# Altium integrated library Samtec_2,54_mm_Pitch_Socket_Strips.IntLib: 489 symbols (part 1 of 4) (continued)
## ESW-127-12-L-D
designator J?
Elevated Socket, Through-hole, Vertical, -55 to 125 degC, 2.54 mm Pitch, 54-Pin, Female, RoHS; Manufacturer: Samtec; PartNumber: ESW-127-12-L-D; Pitch: 2.54 mm; DatasheetVersion: F-214; PackageVersion: AV, 7/1985; PackageReference: ESW-127-12-X-D; PackageDescription: ESW Strip ASM; Orientation: Vertical; RoHS: True; Temperature Range: -55 to 125 degC; Mounting Technology: Through-hole; ComponentLink1Description: Manufacturer URL; ComponentLink1URL: http://www.samtec.com; ComponentLink2Description: Datasheet; ComponentLink2URL: http://www.samtec.com/documents/webfiles/pdf/ESW_TH.PDF; ComponentLink3Description: Package Specification; ComponentLink3URL: http://www.samtec.com/documents/webfiles/cpdf/ESW-1XX-XX-X-X-XX-XX-MKT.pdf
footprint SMTC-ESW-127-12-X-D (Elevated Socket, 2x27 Pins, Vertical, 2.54mm Pitch, Female)
pins: 1, 2, 3, 4, 5, 6, 7, 8, 9, 10, 11, 12, 13, 14, 15, 16, 17, 18, 19, 20, 21, 22, 23, 24, 25, 26, 27, 28, 29, 30, 31, 32, 33, 34, 35, 36, 37, 38, 39, 40, 41, 42, 43, 44, 45, 46, 47, 48, 49, 50, 51, 52, 53, 54

## ESW-127-12-T-D
designator J?
Elevated Socket, Through-hole, Vertical, -55 to 105 degC, 2.54 mm Pitch, 54-Pin, Female, RoHS; Manufacturer: Samtec; PartNumber: ESW-127-12-T-D; Pitch: 2.54 mm; DatasheetVersion: F-214; PackageVersion: AV, 7/1985; PackageReference: ESW-127-12-X-D; PackageDescription: ESW Strip ASM; Orientation: Vertical; RoHS: True; Temperature Range: -55 to 105 degC; Mounting Technology: Through-hole; ComponentLink1Description: Manufacturer URL; ComponentLink1URL: http://www.samtec.com; ComponentLink2Description: Datasheet; ComponentLink2URL: http://www.samtec.com/documents/webfiles/pdf/ESW_TH.PDF; ComponentLink3Description: Package Specification; ComponentLink3URL: http://www.samtec.com/documents/webfiles/cpdf/ESW-1XX-XX-X-X-XX-XX-MKT.pdf
footprint SMTC-ESW-127-12-X-D (Elevated Socket, 2x27 Pins, Vertical, 2.54mm Pitch, Female)
pins: 1, 2, 3, 4, 5, 6, 7, 8, 9, 10, 11, 12, 13, 14, 15, 16, 17, 18, 19, 20, 21, 22, 23, 24, 25, 26, 27, 28, 29, 30, 31, 32, 33, 34, 35, 36, 37, 38, 39, 40, 41, 42, 43, 44, 45, 46, 47, 48, 49, 50, 51, 52, 53, 54

## ESW-129-12-G-D
designator J?
Elevated Socket, Through-hole, Vertical, -55 to 125 degC, 2.54 mm Pitch, 58-Pin, Female, RoHS; Manufacturer: Samtec; PartNumber: ESW-129-12-G-D; Pitch: 2.54 mm; DatasheetVersion: F-214; PackageVersion: AV, 7/1985; PackageReference: ESW-129-12-X-D; PackageDescription: ESW Strip ASM; Orientation: Vertical; RoHS: True; Temperature Range: -55 to 125 degC; Mounting Technology: Through-hole; ComponentLink1Description: Manufacturer URL; ComponentLink1URL: http://www.samtec.com; ComponentLink2Description: Datasheet; ComponentLink2URL: http://www.samtec.com/documents/webfiles/pdf/ESW_TH.PDF; ComponentLink3Description: Package Specification; ComponentLink3URL: http://www.samtec.com/documents/webfiles/cpdf/ESW-1XX-XX-X-X-XX-XX-MKT.pdf
footprint SMTC-ESW-129-12-X-D (Elevated Socket, 2x29 Pins, Vertical, 2.54mm Pitch, Female)
pins: 1, 2, 3, 4, 5, 6, 7, 8, 9, 10, 11, 12, 13, 14, 15, 16, 17, 18, 19, 20, 21, 22, 23, 24, 25, 26, 27, 28, 29, 30, 31, 32, 33, 34, 35, 36, 37, 38, 39, 40, 41, 42, 43, 44, 45, 46, 47, 48, 49, 50, 51, 52, 53, 54, 55, 56, 57, 58

## ESW-129-12-L-D
designator J?
Elevated Socket, Through-hole, Vertical, -55 to 125 degC, 2.54 mm Pitch, 58-Pin, Female, RoHS; Manufacturer: Samtec; PartNumber: ESW-129-12-L-D; Pitch: 2.54 mm; DatasheetVersion: F-214; PackageVersion: AV, 7/1985; PackageReference: ESW-129-12-X-D; PackageDescription: ESW Strip ASM; Orientation: Vertical; RoHS: True; Temperature Range: -55 to 125 degC; Mounting Technology: Through-hole; ComponentLink1Description: Manufacturer URL; ComponentLink1URL: http://www.samtec.com; ComponentLink2Description: Datasheet; ComponentLink2URL: http://www.samtec.com/documents/webfiles/pdf/ESW_TH.PDF; ComponentLink3Description: Package Specification; ComponentLink3URL: http://www.samtec.com/documents/webfiles/cpdf/ESW-1XX-XX-X-X-XX-XX-MKT.pdf
footprint SMTC-ESW-129-12-X-D (Elevated Socket, 2x29 Pins, Vertical, 2.54mm Pitch, Female)
pins: 1, 2, 3, 4, 5, 6, 7, 8, 9, 10, 11, 12, 13, 14, 15, 16, 17, 18, 19, 20, 21, 22, 23, 24, 25, 26, 27, 28, 29, 30, 31, 32, 33, 34, 35, 36, 37, 38, 39, 40, 41, 42, 43, 44, 45, 46, 47, 48, 49, 50, 51, 52, 53, 54, 55, 56, 57, 58

## ESW-129-12-T-D
designator J?
Elevated Socket, Through-hole, Vertical, -55 to 105 degC, 2.54 mm Pitch, 58-Pin, Female, RoHS; Manufacturer: Samtec; PartNumber: ESW-129-12-T-D; Pitch: 2.54 mm; DatasheetVersion: F-214; PackageVersion: AV, 7/1985; PackageReference: ESW-129-12-X-D; PackageDescription: ESW Strip ASM; Orientation: Vertical; RoHS: True; Temperature Range: -55 to 105 degC; Mounting Technology: Through-hole; ComponentLink1Description: Manufacturer URL; ComponentLink1URL: http://www.samtec.com; ComponentLink2Description: Datasheet; ComponentLink2URL: http://www.samtec.com/documents/webfiles/pdf/ESW_TH.PDF; ComponentLink3Description: Package Specification; ComponentLink3URL: http://www.samtec.com/documents/webfiles/cpdf/ESW-1XX-XX-X-X-XX-XX-MKT.pdf
footprint SMTC-ESW-129-12-X-D (Elevated Socket, 2x29 Pins, Vertical, 2.54mm Pitch, Female)
pins: 1, 2, 3, 4, 5, 6, 7, 8, 9, 10, 11, 12, 13, 14, 15, 16, 17, 18, 19, 20, 21, 22, 23, 24, 25, 26, 27, 28, 29, 30, 31, 32, 33, 34, 35, 36, 37, 38, 39, 40, 41, 42, 43, 44, 45, 46, 47, 48, 49, 50, 51, 52, 53, 54, 55, 56, 57, 58

## ESW-129-44-G-D
designator J?
Elevated Socket, Through-hole, Vertical, -55 to 125 degC, 2.54 mm Pitch, 58-Pin, Female, RoHS; Manufacturer: Samtec; PartNumber: ESW-129-44-G-D; Pitch: 2.54 mm; DatasheetVersion: F-214; PackageVersion: AV, 7/1985; PackageReference: ESW-129-44-X-D; PackageDescription: ESW Strip ASM; Orientation: Vertical; RoHS: True; Temperature Range: -55 to 125 degC; Mounting Technology: Through-hole; ComponentLink1Description: Manufacturer URL; ComponentLink1URL: http://www.samtec.com; ComponentLink2Description: Datasheet; ComponentLink2URL: http://www.samtec.com/documents/webfiles/pdf/ESW_TH.PDF; ComponentLink3Description: Package Specification; ComponentLink3URL: http://www.samtec.com/documents/webfiles/cpdf/ESW-1XX-XX-X-X-XX-XX-MKT.pdf
footprint SMTC-ESW-129-44-X-D (Elevated Socket, 2x29 Pins, Vertical, 2.54mm Pitch, Female)
pins: 1, 2, 3, 4, 5, 6, 7, 8, 9, 10, 11, 12, 13, 14, 15, 16, 17, 18, 19, 20, 21, 22, 23, 24, 25, 26, 27, 28, 29, 30, 31, 32, 33, 34, 35, 36, 37, 38, 39, 40, 41, 42, 43, 44, 45, 46, 47, 48, 49, 50, 51, 52, 53, 54, 55, 56, 57, 58

## ESW-129-44-L-D
designator J?
Elevated Socket, Through-hole, Vertical, -55 to 125 degC, 2.54 mm Pitch, 58-Pin, Female, RoHS; Manufacturer: Samtec; PartNumber: ESW-129-44-L-D; Pitch: 2.54 mm; DatasheetVersion: F-214; PackageVersion: AV, 7/1985; PackageReference: ESW-129-44-X-D; PackageDescription: ESW Strip ASM; Orientation: Vertical; RoHS: True; Temperature Range: -55 to 125 degC; Mounting Technology: Through-hole; ComponentLink1Description: Manufacturer URL; ComponentLink1URL: http://www.samtec.com; ComponentLink2Description: Datasheet; ComponentLink2URL: http://www.samtec.com/documents/webfiles/pdf/ESW_TH.PDF; ComponentLink3Description: Package Specification; ComponentLink3URL: http://www.samtec.com/documents/webfiles/cpdf/ESW-1XX-XX-X-X-XX-XX-MKT.pdf
footprint SMTC-ESW-129-44-X-D (Elevated Socket, 2x29 Pins, Vertical, 2.54mm Pitch, Female)
pins: 1, 2, 3, 4, 5, 6, 7, 8, 9, 10, 11, 12, 13, 14, 15, 16, 17, 18, 19, 20, 21, 22, 23, 24, 25, 26, 27, 28, 29, 30, 31, 32, 33, 34, 35, 36, 37, 38, 39, 40, 41, 42, 43, 44, 45, 46, 47, 48, 49, 50, 51, 52, 53, 54, 55, 56, 57, 58

## ESW-129-44-T-D
designator J?
Elevated Socket, Through-hole, Vertical, -55 to 105 degC, 2.54 mm Pitch, 58-Pin, Female, RoHS; Manufacturer: Samtec; PartNumber: ESW-129-44-T-D; Pitch: 2.54 mm; DatasheetVersion: F-214; PackageVersion: AV, 7/1985; PackageReference: ESW-129-44-X-D; PackageDescription: ESW Strip ASM; Orientation: Vertical; RoHS: True; Temperature Range: -55 to 105 degC; Mounting Technology: Through-hole; ComponentLink1Description: Manufacturer URL; ComponentLink1URL: http://www.samtec.com; ComponentLink2Description: Datasheet; ComponentLink2URL: http://www.samtec.com/documents/webfiles/pdf/ESW_TH.PDF; ComponentLink3Description: Package Specification; ComponentLink3URL: http://www.samtec.com/documents/webfiles/cpdf/ESW-1XX-XX-X-X-XX-XX-MKT.pdf
footprint SMTC-ESW-129-44-X-D (Elevated Socket, 2x29 Pins, Vertical, 2.54mm Pitch, Female)
pins: 1, 2, 3, 4, 5, 6, 7, 8, 9, 10, 11, 12, 13, 14, 15, 16, 17, 18, 19, 20, 21, 22, 23, 24, 25, 26, 27, 28, 29, 30, 31, 32, 33, 34, 35, 36, 37, 38, 39, 40, 41, 42, 43, 44, 45, 46, 47, 48, 49, 50, 51, 52, 53, 54, 55, 56, 57, 58

## ESW-135-24-G-D
designator J?
Elevated Socket, Through-hole, Vertical, -55 to 125 degC, 2.54 mm Pitch, 70-Pin, Female, RoHS; Manufacturer: Samtec; PartNumber: ESW-135-24-G-D; Pitch: 2.54 mm; DatasheetVersion: F-214; PackageVersion: AV, 7/1985; PackageReference: ESW-135-24-X-D; PackageDescription: ESW Strip ASM; Orientation: Vertical; RoHS: True; Temperature Range: -55 to 125 degC; Mounting Technology: Through-hole; ComponentLink1Description: Manufacturer URL; ComponentLink1URL: http://www.samtec.com; ComponentLink2Description: Datasheet; ComponentLink2URL: http://www.samtec.com/documents/webfiles/pdf/ESW_TH.PDF; ComponentLink3Description: Package Specification; ComponentLink3URL: http://www.samtec.com/documents/webfiles/cpdf/ESW-1XX-XX-X-X-XX-XX-MKT.pdf
footprint SMTC-ESW-135-24-X-D (Elevated Socket, 2x35 Pins, Vertical, 2.54mm Pitch, Female)
pins: 1, 2, 3, 4, 5, 6, 7, 8, 9, 10, 11, 12, 13, 14, 15, 16, 17, 18, 19, 20, 21, 22, 23, 24, 25, 26, 27, 28, 29, 30, 31, 32, 33, 34, 35, 36, 37, 38, 39, 40, 41, 42, 43, 44, 45, 46, 47, 48, 49, 50, 51, 52, 53, 54, 55, 56, 57, 58, 59, 60, 61, 62, 63, 64, 65, 66, 67, 68, 69, 70

## ESW-135-24-L-D
designator J?
Elevated Socket, Through-hole, Vertical, -55 to 125 degC, 2.54 mm Pitch, 70-Pin, Female, RoHS; Manufacturer: Samtec; PartNumber: ESW-135-24-L-D; Pitch: 2.54 mm; DatasheetVersion: F-214; PackageVersion: AV, 7/1985; PackageReference: ESW-135-24-X-D; PackageDescription: ESW Strip ASM; Orientation: Vertical; RoHS: True; Temperature Range: -55 to 125 degC; Mounting Technology: Through-hole; ComponentLink1Description: Manufacturer URL; ComponentLink1URL: http://www.samtec.com; ComponentLink2Description: Datasheet; ComponentLink2URL: http://www.samtec.com/documents/webfiles/pdf/ESW_TH.PDF; ComponentLink3Description: Package Specification; ComponentLink3URL: http://www.samtec.com/documents/webfiles/cpdf/ESW-1XX-XX-X-X-XX-XX-MKT.pdf
footprint SMTC-ESW-135-24-X-D (Elevated Socket, 2x35 Pins, Vertical, 2.54mm Pitch, Female)
pins: 1, 2, 3, 4, 5, 6, 7, 8, 9, 10, 11, 12, 13, 14, 15, 16, 17, 18, 19, 20, 21, 22, 23, 24, 25, 26, 27, 28, 29, 30, 31, 32, 33, 34, 35, 36, 37, 38, 39, 40, 41, 42, 43, 44, 45, 46, 47, 48, 49, 50, 51, 52, 53, 54, 55, 56, 57, 58, 59, 60, 61, 62, 63, 64, 65, 66, 67, 68, 69, 70

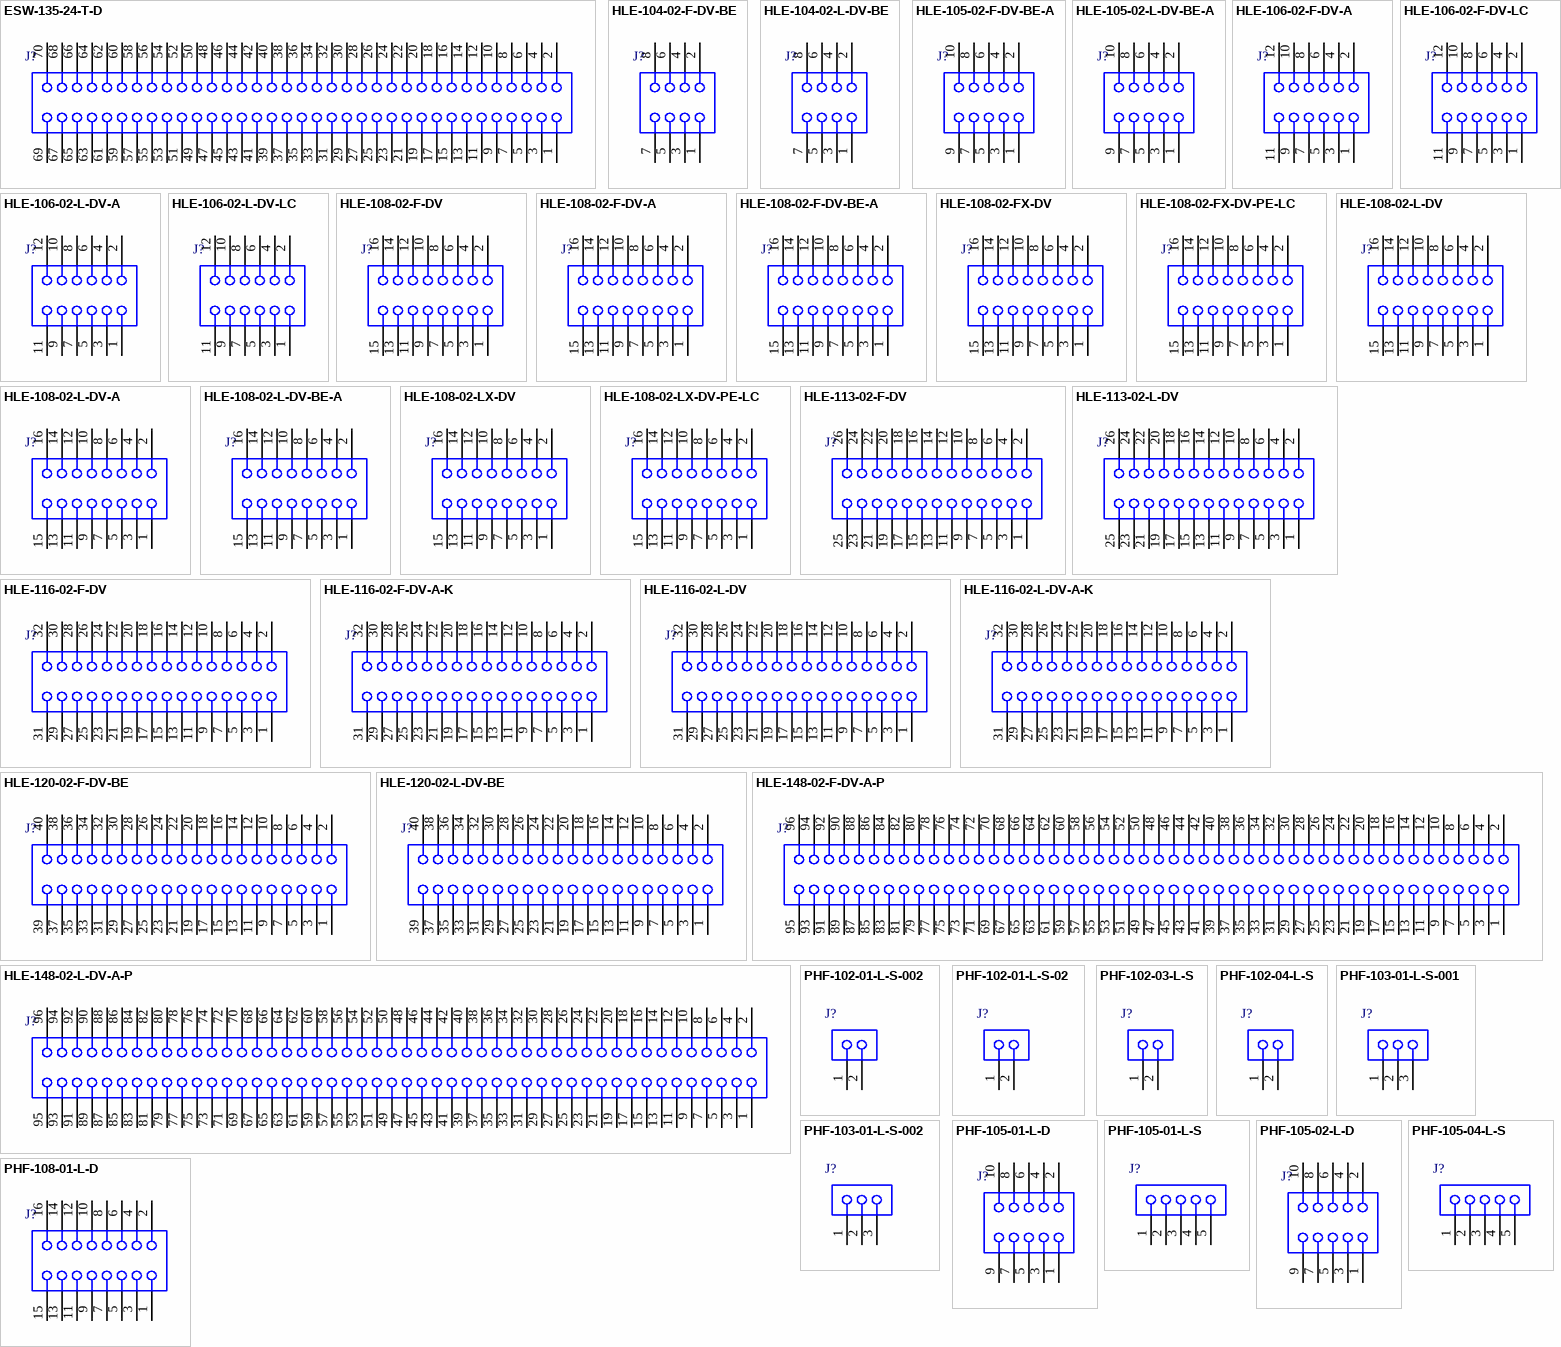
[diagram p2: symbols ESW-135-24-T-D to PHF-108-01-L-D]

## ESW-135-24-T-D
designator J?
Elevated Socket, Through-hole, Vertical, -55 to 105 degC, 2.54 mm Pitch, 70-Pin, Female, RoHS; Manufacturer: Samtec; PartNumber: ESW-135-24-T-D; Pitch: 2.54 mm; DatasheetVersion: F-214; PackageVersion: AV, 7/1985; PackageReference: ESW-135-24-X-D; PackageDescription: ESW Strip ASM; Orientation: Vertical; RoHS: True; Temperature Range: -55 to 105 degC; Mounting Technology: Through-hole; ComponentLink1Description: Manufacturer URL; ComponentLink1URL: http://www.samtec.com; ComponentLink2Description: Datasheet; ComponentLink2URL: http://www.samtec.com/documents/webfiles/pdf/ESW_TH.PDF; ComponentLink3Description: Package Specification; ComponentLink3URL: http://www.samtec.com/documents/webfiles/cpdf/ESW-1XX-XX-X-X-XX-XX-MKT.pdf
footprint SMTC-ESW-135-24-X-D (Elevated Socket, 2x35 Pins, Vertical, 2.54mm Pitch, Female)
pins: 1, 2, 3, 4, 5, 6, 7, 8, 9, 10, 11, 12, 13, 14, 15, 16, 17, 18, 19, 20, 21, 22, 23, 24, 25, 26, 27, 28, 29, 30, 31, 32, 33, 34, 35, 36, 37, 38, 39, 40, 41, 42, 43, 44, 45, 46, 47, 48, 49, 50, 51, 52, 53, 54, 55, 56, 57, 58, 59, 60, 61, 62, 63, 64, 65, 66, 67, 68, 69, 70

## HLE-104-02-F-DV-BE
designator J?
Cost-Effective Reliable Socket, Surface Mount, Vertical, -55 to 125 degC, 2.54 mm Pitch, 8-Pin, Female, RoHS; Manufacturer: Samtec; PartNumber: HLE-104-02-F-DV-BE; Pitch: 2.54 mm; DatasheetVersion: F-214; PackageVersion: AQ, 12/1998; PackageReference: HLE-104-02-X-DV-BE; PackageDescription: .100 Tiger Beam Socket Assembly; Orientation: Vertical; RoHS: True; Temperature Range: -55 to 125 degC; Mounting Technology: Surface Mount; ComponentLink1Description: Manufacturer URL; ComponentLink1URL: http://www.samtec.com; ComponentLink2Description: Datasheet; ComponentLink2URL: http://www.samtec.com/documents/webfiles/pdf/HLE.PDF; ComponentLink3Description: Package Specification; ComponentLink3URL: http://www.samtec.com/documents/webfiles/cpdf/HLE-1XX-02-XXX-DV-XX-XX-XX-MKT.pdf
footprint SMTC-HLE-104-02-X-DV-BE (Tiger Beam Socket Assembly, 2x4 Pins, Vertical, 2.54mm Pitch, Female)
pins: 1, 2, 3, 4, 5, 6, 7, 8

## HLE-104-02-L-DV-BE
designator J?
Cost-Effective Reliable Socket, Surface Mount, Vertical, -55 to 125 degC, 2.54 mm Pitch, 8-Pin, Female, RoHS; Manufacturer: Samtec; PartNumber: HLE-104-02-L-DV-BE; Pitch: 2.54 mm; DatasheetVersion: F-214; PackageVersion: AQ, 12/1998; PackageReference: HLE-104-02-X-DV-BE; PackageDescription: .100 Tiger Beam Socket Assembly; Orientation: Vertical; RoHS: True; Temperature Range: -55 to 125 degC; Mounting Technology: Surface Mount; ComponentLink1Description: Manufacturer URL; ComponentLink1URL: http://www.samtec.com; ComponentLink2Description: Datasheet; ComponentLink2URL: http://www.samtec.com/documents/webfiles/pdf/HLE.PDF; ComponentLink3Description: Package Specification; ComponentLink3URL: http://www.samtec.com/documents/webfiles/cpdf/HLE-1XX-02-XXX-DV-XX-XX-XX-MKT.pdf
footprint SMTC-HLE-104-02-X-DV-BE (Tiger Beam Socket Assembly, 2x4 Pins, Vertical, 2.54mm Pitch, Female)
pins: 1, 2, 3, 4, 5, 6, 7, 8

## HLE-105-02-F-DV-BE-A
designator J?
Cost-Effective Reliable Socket, Surface Mount, Vertical, -55 to 125 degC, 2.54 mm Pitch, 10-Pin, Female, RoHS; Manufacturer: Samtec; PartNumber: HLE-105-02-F-DV-BE-A; Pitch: 2.54 mm; DatasheetVersion: F-214; PackageVersion: AQ, 12/1998; PackageReference: HLE-105-02-X-DV-BE-A; PackageDescription: .100 Tiger Beam Socket Assembly; Orientation: Vertical; RoHS: True; Temperature Range: -55 to 125 degC; Mounting Technology: Surface Mount; ComponentLink1Description: Manufacturer URL; ComponentLink1URL: http://www.samtec.com; ComponentLink2Description: Datasheet; ComponentLink2URL: http://www.samtec.com/documents/webfiles/pdf/HLE.PDF; ComponentLink3Description: Package Specification; ComponentLink3URL: http://www.samtec.com/documents/webfiles/cpdf/HLE-1XX-02-XXX-DV-XX-XX-XX-MKT.pdf
footprint SMTC-HLE-105-02-X-DV-BE-A (Tiger Beam Socket Assembly, 2x5 Pins, Vertical, 2.54mm Pitch, Female)
pins: 1, 2, 3, 4, 5, 6, 7, 8, 9, 10

## HLE-105-02-L-DV-BE-A
designator J?
Cost-Effective Reliable Socket, Surface Mount, Vertical, -55 to 125 degC, 2.54 mm Pitch, 10-Pin, Female, RoHS; Manufacturer: Samtec; PartNumber: HLE-105-02-L-DV-BE-A; Pitch: 2.54 mm; DatasheetVersion: F-214; PackageVersion: AQ, 12/1998; PackageReference: HLE-105-02-X-DV-BE-A; PackageDescription: .100 Tiger Beam Socket Assembly; Supplier 1: Newark; Supplier Part Number 1: 18X2357; Orientation: Vertical; RoHS: True; Temperature Range: -55 to 125 degC; Mounting Technology: Surface Mount; ComponentLink1Description: Manufacturer URL; ComponentLink1URL: http://www.samtec.com; ComponentLink2Description: Datasheet; ComponentLink2URL: http://www.samtec.com/documents/webfiles/pdf/HLE.PDF; ComponentLink3Description: Package Specification; ComponentLink3URL: http://www.samtec.com/documents/webfiles/cpdf/HLE-1XX-02-XXX-DV-XX-XX-XX-MKT.pdf
footprint SMTC-HLE-105-02-X-DV-BE-A (Tiger Beam Socket Assembly, 2x5 Pins, Vertical, 2.54mm Pitch, Female)
pins: 1, 2, 3, 4, 5, 6, 7, 8, 9, 10

## HLE-106-02-F-DV-A
designator J?
Cost-Effective Reliable Socket, Surface Mount, Vertical, -55 to 125 degC, 2.54 mm Pitch, 12-Pin, Female, RoHS; Manufacturer: Samtec; PartNumber: HLE-106-02-F-DV-A; Pitch: 2.54 mm; DatasheetVersion: F-214; PackageVersion: AQ, 12/1998; PackageReference: HLE-106-02-X-DV-A; PackageDescription: .100 Tiger Beam Socket Assembly; Orientation: Vertical; RoHS: True; Temperature Range: -55 to 125 degC; Mounting Technology: Surface Mount; ComponentLink1Description: Manufacturer URL; ComponentLink1URL: http://www.samtec.com; ComponentLink2Description: Datasheet; ComponentLink2URL: http://www.samtec.com/documents/webfiles/pdf/HLE.PDF; ComponentLink3Description: Package Specification; ComponentLink3URL: http://www.samtec.com/documents/webfiles/cpdf/HLE-1XX-02-XXX-DV-XX-XX-XX-MKT.pdf
footprint SMTC-HLE-106-02-X-DV-A (Tiger Beam Socket Assembly, 2x6 Pins, Vertical, 2.54mm Pitch, Female)
pins: 1, 2, 3, 4, 5, 6, 7, 8, 9, 10, 11, 12

## HLE-106-02-F-DV-LC
designator J?
Cost-Effective Reliable Socket, Surface Mount, Vertical, -55 to 125 degC, 2.54 mm Pitch, 12-Pin, Female, RoHS; Manufacturer: Samtec; PartNumber: HLE-106-02-F-DV-LC; Pitch: 2.54 mm; DatasheetVersion: F-214; PackageVersion: AQ, 12/1998; PackageReference: HLE-106-02-X-DV-LC; PackageDescription: .100 Tiger Beam Socket Assembly; Orientation: Vertical; RoHS: True; Temperature Range: -55 to 125 degC; Mounting Technology: Surface Mount; ComponentLink1Description: Manufacturer URL; ComponentLink1URL: http://www.samtec.com; ComponentLink2Description: Datasheet; ComponentLink2URL: http://www.samtec.com/documents/webfiles/pdf/HLE.PDF; ComponentLink3Description: Package Specification; ComponentLink3URL: http://www.samtec.com/documents/webfiles/cpdf/HLE-1XX-02-XXX-DV-XX-XX-XX-MKT.pdf
footprint SMTC-HLE-106-02-X-DV-LC (Tiger Beam Socket Assembly, 2x6 Pins, Vertical, 2.54mm Pitch, Female)
pins: 1, 2, 3, 4, 5, 6, 7, 8, 9, 10, 11, 12

## HLE-106-02-L-DV-A
designator J?
Cost-Effective Reliable Socket, Surface Mount, Vertical, -55 to 125 degC, 2.54 mm Pitch, 12-Pin, Female, RoHS; Manufacturer: Samtec; PartNumber: HLE-106-02-L-DV-A; Pitch: 2.54 mm; DatasheetVersion: F-214; PackageVersion: AQ, 12/1998; PackageReference: HLE-106-02-X-DV-A; PackageDescription: .100 Tiger Beam Socket Assembly; Orientation: Vertical; RoHS: True; Temperature Range: -55 to 125 degC; Mounting Technology: Surface Mount; ComponentLink1Description: Manufacturer URL; ComponentLink1URL: http://www.samtec.com; ComponentLink2Description: Datasheet; ComponentLink2URL: http://www.samtec.com/documents/webfiles/pdf/HLE.PDF; ComponentLink3Description: Package Specification; ComponentLink3URL: http://www.samtec.com/documents/webfiles/cpdf/HLE-1XX-02-XXX-DV-XX-XX-XX-MKT.pdf
footprint SMTC-HLE-106-02-X-DV-A (Tiger Beam Socket Assembly, 2x6 Pins, Vertical, 2.54mm Pitch, Female)
pins: 1, 2, 3, 4, 5, 6, 7, 8, 9, 10, 11, 12

## HLE-106-02-L-DV-LC
designator J?
Cost-Effective Reliable Socket, Surface Mount, Vertical, -55 to 125 degC, 2.54 mm Pitch, 12-Pin, Female, RoHS; Manufacturer: Samtec; PartNumber: HLE-106-02-L-DV-LC; Pitch: 2.54 mm; DatasheetVersion: F-214; PackageVersion: AQ, 12/1998; PackageReference: HLE-106-02-X-DV-LC; PackageDescription: .100 Tiger Beam Socket Assembly; Orientation: Vertical; RoHS: True; Temperature Range: -55 to 125 degC; Mounting Technology: Surface Mount; ComponentLink1Description: Manufacturer URL; ComponentLink1URL: http://www.samtec.com; ComponentLink2Description: Datasheet; ComponentLink2URL: http://www.samtec.com/documents/webfiles/pdf/HLE.PDF; ComponentLink3Description: Package Specification; ComponentLink3URL: http://www.samtec.com/documents/webfiles/cpdf/HLE-1XX-02-XXX-DV-XX-XX-XX-MKT.pdf
footprint SMTC-HLE-106-02-X-DV-LC (Tiger Beam Socket Assembly, 2x6 Pins, Vertical, 2.54mm Pitch, Female)
pins: 1, 2, 3, 4, 5, 6, 7, 8, 9, 10, 11, 12

## HLE-108-02-F-DV
designator J?
Cost-Effective Reliable Socket, Surface Mount, Vertical, -55 to 125 degC, 2.54 mm Pitch, 16-Pin, Female, RoHS; Manufacturer: Samtec; PartNumber: HLE-108-02-F-DV; Pitch: 2.54 mm; DatasheetVersion: F-214; PackageVersion: AQ, 12/1998; PackageReference: HLE-108-02-X-DV; PackageDescription: .100 Tiger Beam Socket Assembly; Orientation: Vertical; RoHS: True; Temperature Range: -55 to 125 degC; Mounting Technology: Surface Mount; ComponentLink1Description: Manufacturer URL; ComponentLink1URL: http://www.samtec.com; ComponentLink2Description: Datasheet; ComponentLink2URL: http://www.samtec.com/documents/webfiles/pdf/HLE.PDF; ComponentLink3Description: Package Specification; ComponentLink3URL: http://www.samtec.com/documents/webfiles/cpdf/HLE-1XX-02-XXX-DV-XX-XX-XX-MKT.pdf
footprint SMTC-HLE-108-02-X-DV (Tiger Beam Socket Assembly, 2x8 Pins, Vertical, 2.54mm Pitch, Female)
pins: 1, 2, 3, 4, 5, 6, 7, 8, 9, 10, 11, 12, 13, 14, 15, 16

## HLE-108-02-F-DV-A
designator J?
Cost-Effective Reliable Socket, Surface Mount, Vertical, -55 to 125 degC, 2.54 mm Pitch, 16-Pin, Female, RoHS; Manufacturer: Samtec; PartNumber: HLE-108-02-F-DV-A; Pitch: 2.54 mm; DatasheetVersion: F-214; PackageVersion: AQ, 12/1998; PackageReference: HLE-108-02-X-DV-A; PackageDescription: .100 Tiger Beam Socket Assembly; Orientation: Vertical; RoHS: True; Temperature Range: -55 to 125 degC; Mounting Technology: Surface Mount; ComponentLink1Description: Manufacturer URL; ComponentLink1URL: http://www.samtec.com; ComponentLink2Description: Datasheet; ComponentLink2URL: http://www.samtec.com/documents/webfiles/pdf/HLE.PDF; ComponentLink3Description: Package Specification; ComponentLink3URL: http://www.samtec.com/documents/webfiles/cpdf/HLE-1XX-02-XXX-DV-XX-XX-XX-MKT.pdf
footprint SMTC-HLE-108-02-X-DV-A (Tiger Beam Socket Assembly, 2x8 Pins, Vertical, 2.54mm Pitch, Female)
pins: 1, 2, 3, 4, 5, 6, 7, 8, 9, 10, 11, 12, 13, 14, 15, 16

## HLE-108-02-F-DV-BE-A
designator J?
Cost-Effective Reliable Socket, Surface Mount, Vertical, -55 to 125 degC, 2.54 mm Pitch, 16-Pin, Female, RoHS; Manufacturer: Samtec; PartNumber: HLE-108-02-F-DV-BE-A; Pitch: 2.54 mm; DatasheetVersion: F-214; PackageVersion: AQ, 12/1998; PackageReference: HLE-108-02-X-DV-BE-A; PackageDescription: .100 Tiger Beam Socket Assembly; Orientation: Vertical; RoHS: True; Temperature Range: -55 to 125 degC; Mounting Technology: Surface Mount; ComponentLink1Description: Manufacturer URL; ComponentLink1URL: http://www.samtec.com; ComponentLink2Description: Datasheet; ComponentLink2URL: http://www.samtec.com/documents/webfiles/pdf/HLE.PDF; ComponentLink3Description: Package Specification; ComponentLink3URL: http://www.samtec.com/documents/webfiles/cpdf/HLE-1XX-02-XXX-DV-XX-XX-XX-MKT.pdf
footprint SMTC-HLE-108-02-X-DV-BE-A (Tiger Beam Socket Assembly, 2x8 Pins, Vertical, 2.54mm Pitch, Female)
pins: 1, 2, 3, 4, 5, 6, 7, 8, 9, 10, 11, 12, 13, 14, 15, 16

## HLE-108-02-FX-DV
designator J?
Cost-Effective Reliable Socket, Surface Mount, Vertical, -55 to 125 degC, 2.54 mm Pitch, 16-Pin, Female, RoHS; Manufacturer: Samtec; PartNumber: HLE-108-02-FX-DV; Pitch: 2.54 mm; DatasheetVersion: F-214; PackageVersion: AQ, 12/1998; PackageReference: HLE-108-02-XX-DV; PackageDescription: .100 Tiger Beam Socket Assembly; Orientation: Vertical; RoHS: True; Temperature Range: -55 to 125 degC; Mounting Technology: Surface Mount; ComponentLink1Description: Manufacturer URL; ComponentLink1URL: http://www.samtec.com; ComponentLink2Description: Datasheet; ComponentLink2URL: http://www.samtec.com/documents/webfiles/pdf/HLE.PDF; ComponentLink3Description: Package Specification; ComponentLink3URL: http://www.samtec.com/documents/webfiles/cpdf/HLE-1XX-02-XXX-DV-XX-XX-XX-MKT.pdf
footprint SMTC-HLE-108-02-XX-DV (Tiger Beam Socket Assembly, 2x8 Pins, Vertical, 2.54mm Pitch, Female)
pins: 1, 2, 3, 4, 5, 6, 7, 8, 9, 10, 11, 12, 13, 14, 15, 16

## HLE-108-02-FX-DV-PE-LC
designator J?
Cost-Effective Reliable Socket, Through-hole, Vertical, -55 to 125 degC, 2.54 mm Pitch, 16-Pin, Female, RoHS; Manufacturer: Samtec; PartNumber: HLE-108-02-FX-DV-PE-LC; Pitch: 2.54 mm; DatasheetVersion: F-214; PackageVersion: AC, 10/1999; PackageReference: HLE-108-02-XX-DV-PE-LC; PackageDescription: .100 C.L. Single Beam Socket Strip; Orientation: Vertical; RoHS: True; Temperature Range: -55 to 125 degC; Mounting Technology: Through-hole; ComponentLink1Description: Manufacturer URL; ComponentLink1URL: http://www.samtec.com; ComponentLink2Description: Datasheet; ComponentLink2URL: http://www.samtec.com/documents/webfiles/pdf/HLE.PDF; ComponentLink3Description: Package Specification; ComponentLink3URL: http://www.samtec.com/documents/webfiles/cpdf/HLE-1XX-02-XX-DV-XE-XX-MKT.pdf
footprint SMTC-HLE-108-02-XX-DV-PE-LC (C.L. Single Beam Socket Strip, 2x8 Pins, Vertical, 2.54mm Pitch, Female)
pins: 1, 2, 3, 4, 5, 6, 7, 8, 9, 10, 11, 12, 13, 14, 15, 16

## HLE-108-02-L-DV
designator J?
Cost-Effective Reliable Socket, Surface Mount, Vertical, -55 to 125 degC, 2.54 mm Pitch, 16-Pin, Female, RoHS; Manufacturer: Samtec; PartNumber: HLE-108-02-L-DV; Pitch: 2.54 mm; DatasheetVersion: F-214; PackageVersion: AQ, 12/1998; PackageReference: HLE-108-02-X-DV; PackageDescription: .100 Tiger Beam Socket Assembly; Supplier 1: Newark; Supplier Part Number 1: 84T4110; Orientation: Vertical; RoHS: True; Temperature Range: -55 to 125 degC; Mounting Technology: Surface Mount; ComponentLink1Description: Manufacturer URL; ComponentLink1URL: http://www.samtec.com; ComponentLink2Description: Datasheet; ComponentLink2URL: http://www.samtec.com/documents/webfiles/pdf/HLE.PDF; ComponentLink3Description: Package Specification; ComponentLink3URL: http://www.samtec.com/documents/webfiles/cpdf/HLE-1XX-02-XXX-DV-XX-XX-XX-MKT.pdf
footprint SMTC-HLE-108-02-X-DV (Tiger Beam Socket Assembly, 2x8 Pins, Vertical, 2.54mm Pitch, Female)
pins: 1, 2, 3, 4, 5, 6, 7, 8, 9, 10, 11, 12, 13, 14, 15, 16

## HLE-108-02-L-DV-A
designator J?
Cost-Effective Reliable Socket, Surface Mount, Vertical, -55 to 125 degC, 2.54 mm Pitch, 16-Pin, Female, RoHS; Manufacturer: Samtec; PartNumber: HLE-108-02-L-DV-A; Pitch: 2.54 mm; DatasheetVersion: F-214; PackageVersion: AQ, 12/1998; PackageReference: HLE-108-02-X-DV-A; PackageDescription: .100 Tiger Beam Socket Assembly; Orientation: Vertical; RoHS: True; Temperature Range: -55 to 125 degC; Mounting Technology: Surface Mount; ComponentLink1Description: Manufacturer URL; ComponentLink1URL: http://www.samtec.com; ComponentLink2Description: Datasheet; ComponentLink2URL: http://www.samtec.com/documents/webfiles/pdf/HLE.PDF; ComponentLink3Description: Package Specification; ComponentLink3URL: http://www.samtec.com/documents/webfiles/cpdf/HLE-1XX-02-XXX-DV-XX-XX-XX-MKT.pdf
footprint SMTC-HLE-108-02-X-DV-A (Tiger Beam Socket Assembly, 2x8 Pins, Vertical, 2.54mm Pitch, Female)
pins: 1, 2, 3, 4, 5, 6, 7, 8, 9, 10, 11, 12, 13, 14, 15, 16

## HLE-108-02-L-DV-BE-A
designator J?
Cost-Effective Reliable Socket, Surface Mount, Vertical, -55 to 125 degC, 2.54 mm Pitch, 16-Pin, Female, RoHS; Manufacturer: Samtec; PartNumber: HLE-108-02-L-DV-BE-A; Pitch: 2.54 mm; DatasheetVersion: F-214; PackageVersion: AQ, 12/1998; PackageReference: HLE-108-02-X-DV-BE-A; PackageDescription: .100 Tiger Beam Socket Assembly; Orientation: Vertical; RoHS: True; Temperature Range: -55 to 125 degC; Mounting Technology: Surface Mount; ComponentLink1Description: Manufacturer URL; ComponentLink1URL: http://www.samtec.com; ComponentLink2Description: Datasheet; ComponentLink2URL: http://www.samtec.com/documents/webfiles/pdf/HLE.PDF; ComponentLink3Description: Package Specification; ComponentLink3URL: http://www.samtec.com/documents/webfiles/cpdf/HLE-1XX-02-XXX-DV-XX-XX-XX-MKT.pdf
footprint SMTC-HLE-108-02-X-DV-BE-A (Tiger Beam Socket Assembly, 2x8 Pins, Vertical, 2.54mm Pitch, Female)
pins: 1, 2, 3, 4, 5, 6, 7, 8, 9, 10, 11, 12, 13, 14, 15, 16

## HLE-108-02-LX-DV
designator J?
Cost-Effective Reliable Socket, Surface Mount, Vertical, -55 to 125 degC, 2.54 mm Pitch, 16-Pin, Female, RoHS; Manufacturer: Samtec; PartNumber: HLE-108-02-LX-DV; Pitch: 2.54 mm; DatasheetVersion: F-214; PackageVersion: AQ, 12/1998; PackageReference: HLE-108-02-XX-DV; PackageDescription: .100 Tiger Beam Socket Assembly; Orientation: Vertical; RoHS: True; Temperature Range: -55 to 125 degC; Mounting Technology: Surface Mount; ComponentLink1Description: Manufacturer URL; ComponentLink1URL: http://www.samtec.com; ComponentLink2Description: Datasheet; ComponentLink2URL: http://www.samtec.com/documents/webfiles/pdf/HLE.PDF; ComponentLink3Description: Package Specification; ComponentLink3URL: http://www.samtec.com/documents/webfiles/cpdf/HLE-1XX-02-XXX-DV-XX-XX-XX-MKT.pdf
footprint SMTC-HLE-108-02-XX-DV (Tiger Beam Socket Assembly, 2x8 Pins, Vertical, 2.54mm Pitch, Female)
pins: 1, 2, 3, 4, 5, 6, 7, 8, 9, 10, 11, 12, 13, 14, 15, 16

## HLE-108-02-LX-DV-PE-LC
designator J?
Cost-Effective Reliable Socket, Through-hole, Vertical, -55 to 125 degC, 2.54 mm Pitch, 16-Pin, Female, RoHS; Manufacturer: Samtec; PartNumber: HLE-108-02-LX-DV-PE-LC; Pitch: 2.54 mm; DatasheetVersion: F-214; PackageVersion: AC, 10/1999; PackageReference: HLE-108-02-XX-DV-PE-LC; PackageDescription: .100 C.L. Single Beam Socket Strip; Orientation: Vertical; RoHS: True; Temperature Range: -55 to 125 degC; Mounting Technology: Through-hole; ComponentLink1Description: Manufacturer URL; ComponentLink1URL: http://www.samtec.com; ComponentLink2Description: Datasheet; ComponentLink2URL: http://www.samtec.com/documents/webfiles/pdf/HLE.PDF; ComponentLink3Description: Package Specification; ComponentLink3URL: http://www.samtec.com/documents/webfiles/cpdf/HLE-1XX-02-XX-DV-XE-XX-MKT.pdf
footprint SMTC-HLE-108-02-XX-DV-PE-LC (C.L. Single Beam Socket Strip, 2x8 Pins, Vertical, 2.54mm Pitch, Female)
pins: 1, 2, 3, 4, 5, 6, 7, 8, 9, 10, 11, 12, 13, 14, 15, 16

## HLE-113-02-F-DV
designator J?
Cost-Effective Reliable Socket, Surface Mount, Vertical, -55 to 125 degC, 2.54 mm Pitch, 26-Pin, Female, RoHS; Manufacturer: Samtec; PartNumber: HLE-113-02-F-DV; Pitch: 2.54 mm; DatasheetVersion: F-214; PackageVersion: AQ, 12/1998; PackageReference: HLE-113-02-X-DV; PackageDescription: .100 Tiger Beam Socket Assembly; Orientation: Vertical; RoHS: True; Temperature Range: -55 to 125 degC; Mounting Technology: Surface Mount; ComponentLink1Description: Manufacturer URL; ComponentLink1URL: http://www.samtec.com; ComponentLink2Description: Datasheet; ComponentLink2URL: http://www.samtec.com/documents/webfiles/pdf/HLE.PDF; ComponentLink3Description: Package Specification; ComponentLink3URL: http://www.samtec.com/documents/webfiles/cpdf/HLE-1XX-02-XXX-DV-XX-XX-XX-MKT.pdf
footprint SMTC-HLE-113-02-X-DV (Tiger Beam Socket Assembly, 2x13 Pins, Vertical, 2.54mm Pitch, Female)
pins: 1, 2, 3, 4, 5, 6, 7, 8, 9, 10, 11, 12, 13, 14, 15, 16, 17, 18, 19, 20, 21, 22, 23, 24, 25, 26
